# Altium integrated library Sajad_Altium_Library.IntLib: 390 symbols (part 1 of 3) (continued)
## ENC28J60T-I/SO (continued)

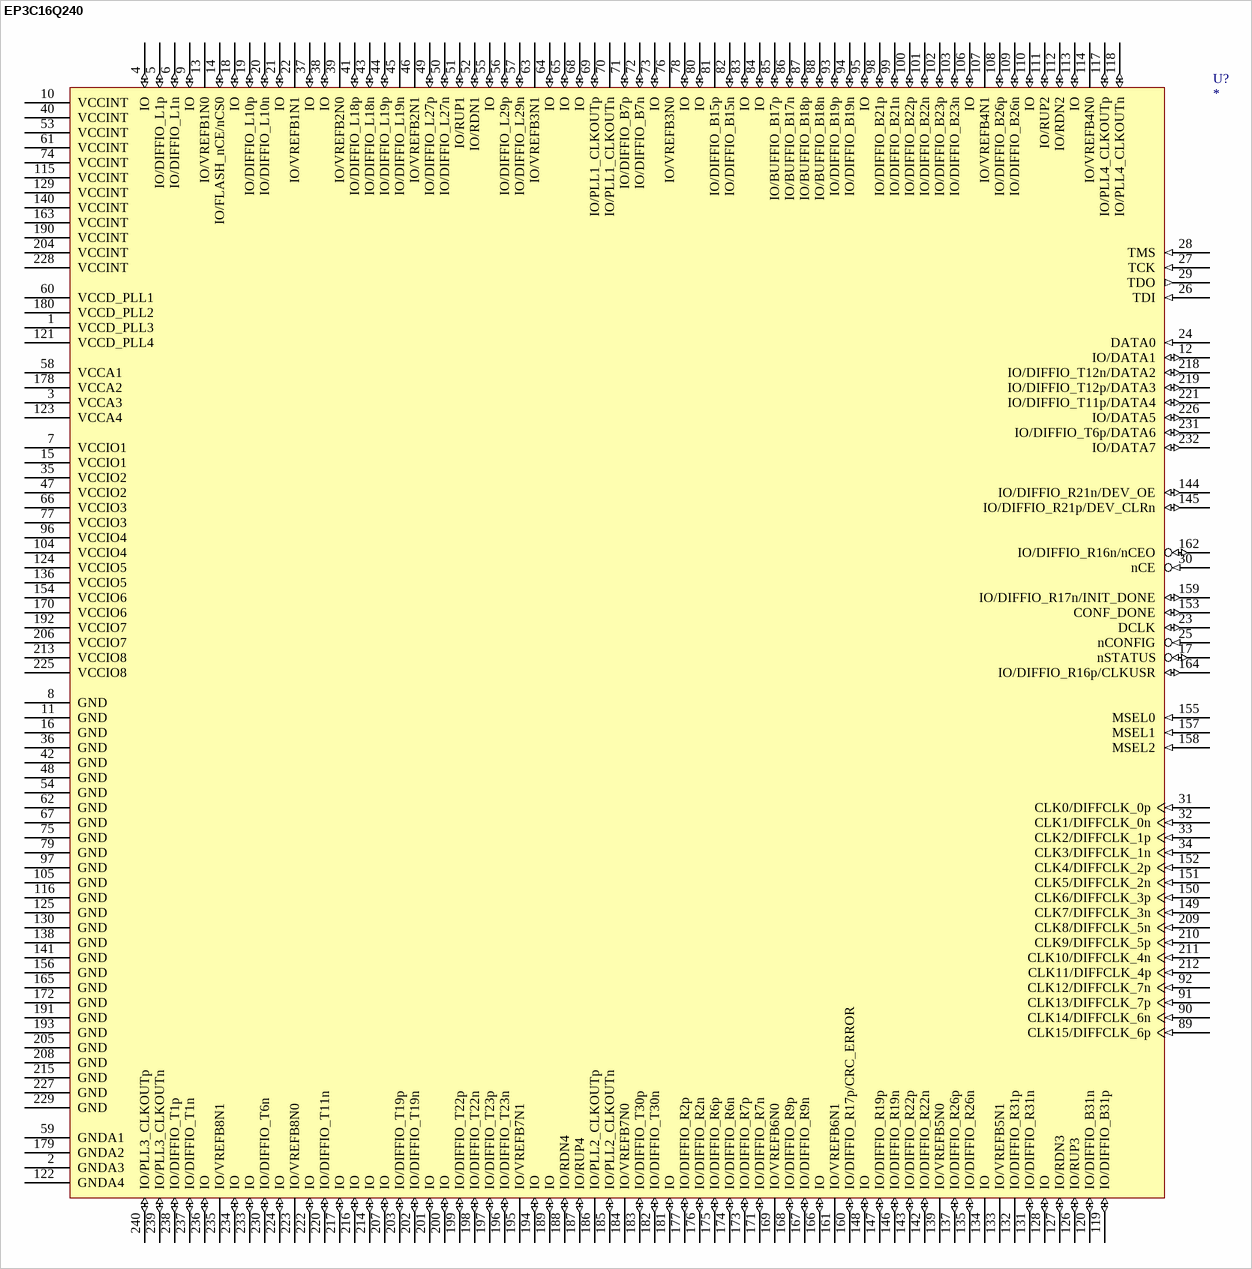
[diagram p3: symbol EP3C16Q240]

## EP3C16Q240
designator U?
Cyclone III EP3C-16 FPGA PQFP240
footprint PQFP240
pins: 1 VCCD_PLL3 (power), 2 GNDA3 (power), 3 VCCA3 (power), 4 IO (io), 5 IO/DIFFIO_L1p (io), 6 IO/DIFFIO_L1n (io), 7 VCCIO1, 8 GND (power), 9 IO (io), 10 VCCINT (power), 11 GND (power), 12 IO/DATA1 (io), 13 IO/VREFB1N0, 14 IO/FLASH_nCE/nCS0 (io), 15 VCCIO1 (power), 16 GND (power), 17 nSTATUS (io), 18 IO (io), 19 IO/DIFFIO_L10p (io), 20 IO/DIFFIO_L10n (io), 21 IO (io), 22 IO/VREFB1N1, 23 DCLK (io), 24 DATA0 (in), 25 nCONFIG (in), 26 TDI (in), 27 TCK (in), 28 TMS (in), 29 TDO (out), 30 nCE (in), 31 CLK0/DIFFCLK_0p (in), 32 CLK1/DIFFCLK_0n (in), 33 CLK2/DIFFCLK_1p (in), 34 CLK3/DIFFCLK_1n (in), 35 VCCIO2 (power), 36 GND, 37 IO (io), 38 IO (io), 39 IO/VREFB2N0, 40 VCCINT (power), 41 IO/DIFFIO_L18p (io), 42 GND, 43 IO/DIFFIO_L18n (io), 44 IO/DIFFIO_L19p (io), 45 IO/DIFFIO_L19n, 46 IO/VREFB2N1, 47 VCCIO2 (power), 48 GND (power), 49 IO/DIFFIO_L27p (io), 50 IO/DIFFIO_L27n (io), 51 IO/RUP1 (io), 52 IO/RDN1 (io), 53 VCCINT (power), 54 GND (power), 55 IO (io), 56 IO/DIFFIO_L29p (io), 57 IO/DIFFIO_L29n (io), 58 VCCA1 (power), 59 GNDA1 (power), 60 VCCD_PLL1 (power), 61 VCCINT (power), 62 GND (power), 63 IO/VREFB3N1, 64 IO (io), 65 IO (io), 66 VCCIO3 (power), 67 GND, 68 IO (io), 69 IO/PLL1_CLKOUTp (io), 70 IO/PLL1_CLKOUTn, 71 IO/DIFFIO_B7p (io), 72 IO/DIFFIO_B7n (io), 73 IO (io), 74 VCCINT (power), 75 GND (power), 76 IO/VREFB3N0, 77 VCCIO3 (power), 78 IO (io), 79 GND (power), 80 IO (io), 81 IO/DIFFIO_B15p, 82 IO/DIFFIO_B15n (io), 83 IO (io), 84 IO (io), 85 IO/BUFFIO_B17p (io), 86 IO/BUFFIO_B17n (io), 87 IO/BUFFIO_B18p (io), 88 IO/BUFFIO_B18n (io), 89 CLK15/DIFFCLK_6p (in), 90 CLK14/DIFFCLK_6n (in), 91 CLK13/DIFFCLK_7p (in), 92 CLK12/DIFFCLK_7n (in), 93 IO/DIFFIO_B19p (io), 94 IO/DIFFIO_B19n (io), 95 IO (io), 96 VCCIO4 (power), 97 GND (power), 98 IO/DIFFIO_B21p (io), 99 IO/DIFFIO_B21n (io), 100 IO/DIFFIO_B22p (io), 101 IO/DIFFIO_B22n (io), 102 IO/DIFFIO_B23p (io), 103 IO/DIFFIO_B23n (io), 104 VCCIO4 (power), 105 GND (power), 106 IO (io), 107 IO/VREFB4N1, 108 IO/DIFFIO_B26p (io), 109 IO/DIFFIO_B26n (io), 110 IO (io), 111 IO/RUP2 (io), 112 IO/RDN2 (io), 113 IO (io), 114 IO/VREFB4N0, 115 VCCINT (power), 116 GND (power), 117 IO/PLL4_CLKOUTp (io), 118 IO/PLL4_CLKOUTn (io), 119 IO/DIFFIO_B31p (io), 120 IO/DIFFIO_B31n (io), 121 VCCD_PLL4 (power), 122 GNDA4 (power), 123 VCCA4 (power), 124 VCCIO5 (power), 125 GND, 126 IO/RUP3 (io), 127 IO/RDN3 (io), 128 IO (io), 129 VCCINT (power), 130 GND (power), 131 IO/DIFFIO_R31n (io), 132 IO/DIFFIO_R31p, 133 IO/VREFB5N1, 134 IO, 135 IO/DIFFIO_R26n (io), 136 VCCIO5 (power), 137 IO/DIFFIO_R26p (io), 138 GND (power), 139 IO/VREFB5N0, 140 VCCINT (power), 141 GND (power), 142 IO/DIFFIO_R22n (io), 143 IO/DIFFIO_R22p (io), 144 IO/DIFFIO_R21n/DEV_OE (io), 145 IO/DIFFIO_R21p/DEV_CLRn (io), 146 IO/DIFFIO_R19n (io), 147 IO/DIFFIO_R19p (io), 148 IO (io), 149 CLK7/DIFFCLK_3n (in), 150 CLK6/DIFFCLK_3p (in), 151 CLK5/DIFFCLK_2n (in), 152 CLK4/DIFFCLK_2p (in), 153 CONF_DONE (io), 154 VCCIO6 (power), 155 MSEL0 (in), 156 GND (power), 157 MSEL1 (in), 158 MSEL2 (in), 159 IO/DIFFIO_R17n/INIT_DONE (io), 160 IO/DIFFIO_R17p/CRC_ERROR (io), 161 IO/VREFB6N1, 162 IO/DIFFIO_R16n/nCEO (io), 163 VCCINT (power), 164 IO/DIFFIO_R16p/CLKUSR (io), 165 GND (power), 166 IO (io), 167 IO/DIFFIO_R9n (io), 168 IO/DIFFIO_R9p (io), 169 IO/VREFB6N0, 170 VCCIO6 (power), 171 IO/DIFFIO_R7n (io), 172 GND (power), 173 IO/DIFFIO_R7p (io), 174 IO/DIFFIO_R6n (io), 175 IO/DIFFIO_R6p (io), 176 IO/DIFFIO_R2n (io), 177 IO/DIFFIO_R2p (io), 178 VCCA2 (power), 179 GNDA2 (power), 180 VCCD_PLL2 (power), 181 IO (io), 182 IO/DIFFIO_T30n (io), 183 IO/DIFFIO_T30p (io), 184 IO/VREFB7N0, 185 IO/PLL2_CLKOUTn (io), 186 IO/PLL2_CLKOUTp, 187 IO/RUP4 (io), 188 IO/RDN4 (io), 189 IO (io), 190 VCCINT (power), 191 GND (power), 192 VCCIO7 (power), 193 GND (power), 194 IO (io), 195 IO/VREFB7N1, 196 IO/DIFFIO_T23n (io), 197 IO/DIFFIO_T23p (io), 198 IO/DIFFIO_T22n (io), 199 IO/DIFFIO_T22p (io), 200 IO (io), 201 IO (io), 202 IO/DIFFIO_T19n (io), 203 IO/DIFFIO_T19p (io), 204 VCCINT (power), 205 GND (power), 206 VCCIO7 (power), 207 IO (io), 208 GND (power), 209 CLK8/DIFFCLK_5n (in), 210 CLK9/DIFFCLK_5p (in), 211 CLK10/DIFFCLK_4n (in), 212 CLK11/DIFFCLK_4p (in), 213 VCCIO8 (power), 214 IO (io), 215 GND (power), 216 IO (io), 217 IO (io), 218 IO/DIFFIO_T12n/DATA2 (io), 219 IO/DIFFIO_T12p/DATA3 (io), 220 IO/DIFFIO_T11n (io), 221 IO/DIFFIO_T11p/DATA4 (io), 222 IO (io), 223 IO/VREFB8N0, 224 IO (io), 225 VCCIO8 (power), 226 IO/DATA5 (io), 227 GND (power), 228 VCCINT (power), 229 GND (power), 230 IO/DIFFIO_T6n (io), 231 IO/DIFFIO_T6p/DATA6 (io), 232 IO/DATA7 (io), 233 IO (io), 234 IO (io), 235 IO/VREFB8N1, 236 IO (io), 237 IO/DIFFIO_T1n (io), 238 IO/DIFFIO_T1p (io), 239 IO/PLL3_CLKOUTn (io), 240 IO/PLL3_CLKOUTp (io)

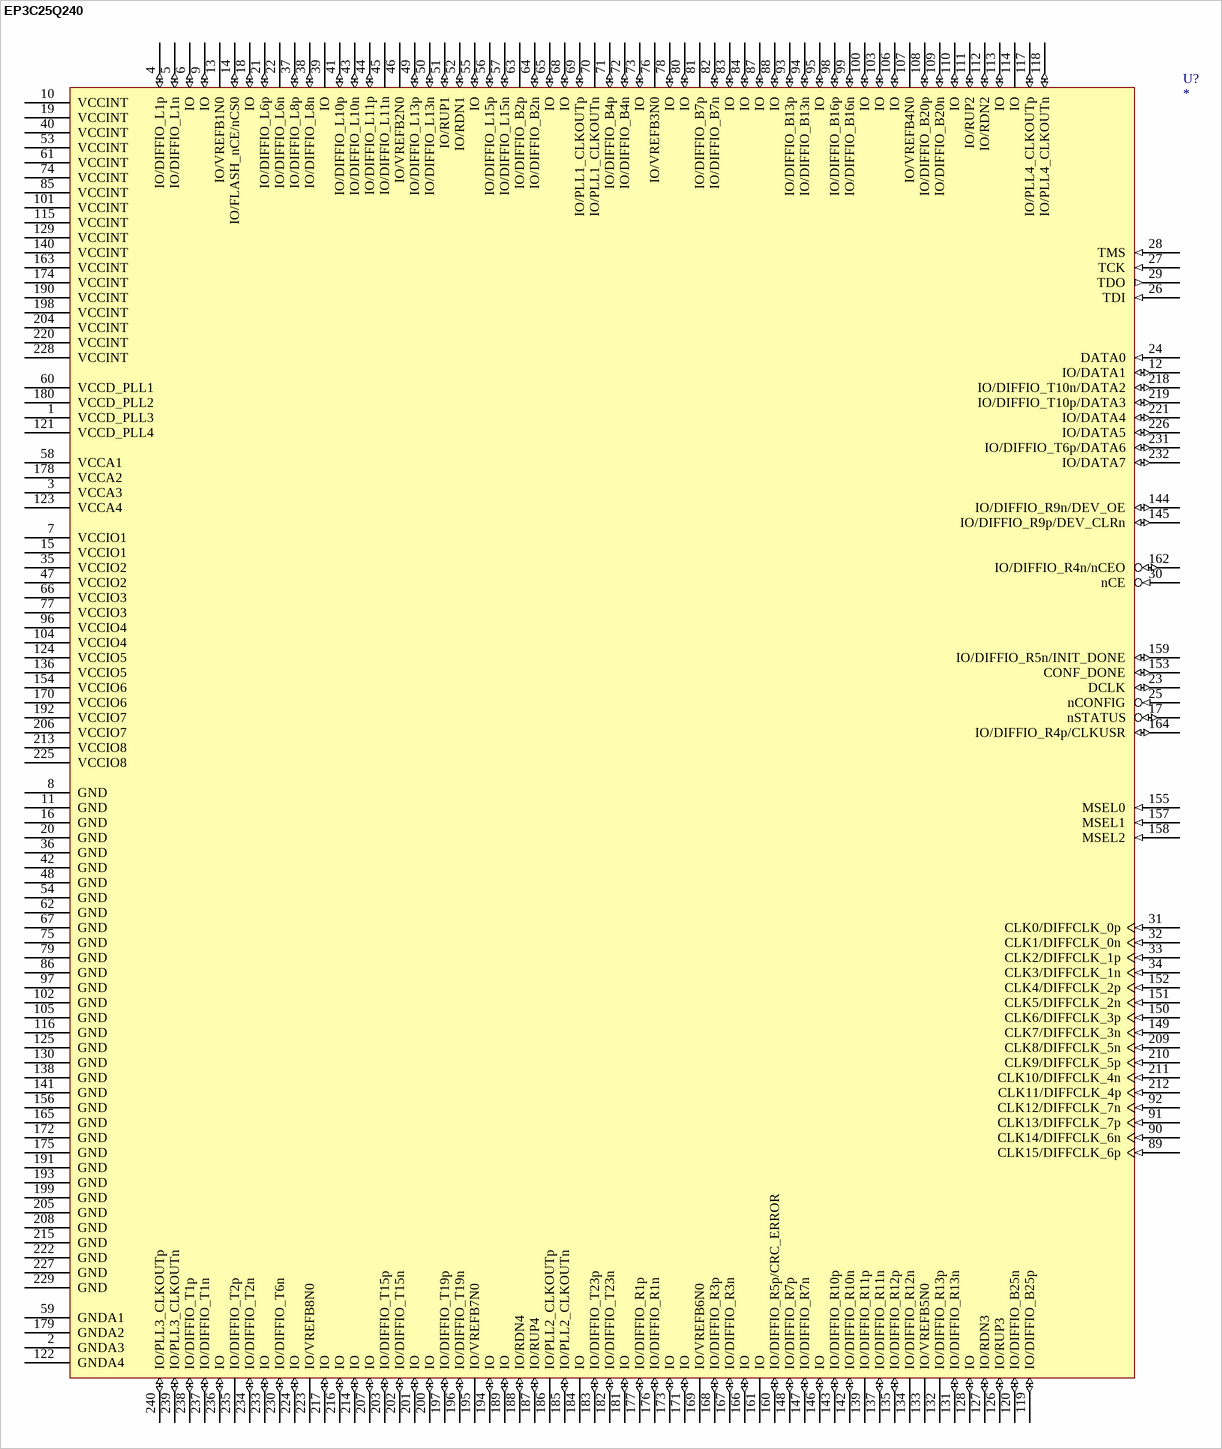
[diagram p4: symbol EP3C25Q240]

## EP3C25Q240
designator U?
Cyclone III EP3C-25 FPGA PQFP240
footprint PQFP240
pins: 1 VCCD_PLL3 (power), 2 GNDA3 (power), 3 VCCA3 (power), 4 IO/DIFFIO_L1p (io), 5 IO/DIFFIO_L1n (io), 6 IO (io), 7 VCCIO1, 8 GND (power), 9 IO (io), 10 VCCINT (power), 11 GND (power), 12 IO/DATA1 (io), 13 IO/VREFB1N0, 14 IO/FLASH_nCE/nCS0 (io), 15 VCCIO1 (power), 16 GND (power), 17 nSTATUS (io), 18 IO (io), 19 VCCINT (power), 20 GND (power), 21 IO/DIFFIO_L6p (io), 22 IO/DIFFIO_L6n, 23 DCLK (io), 24 DATA0 (in), 25 nCONFIG (in), 26 TDI (in), 27 TCK (in), 28 TMS (in), 29 TDO (out), 30 nCE (in), 31 CLK0/DIFFCLK_0p (in), 32 CLK1/DIFFCLK_0n (in), 33 CLK2/DIFFCLK_1p (in), 34 CLK3/DIFFCLK_1n (in), 35 VCCIO2 (power), 36 GND, 37 IO/DIFFIO_L8p (io), 38 IO/DIFFIO_L8n (io), 39 IO, 40 VCCINT (power), 41 IO/DIFFIO_L10p (io), 42 GND, 43 IO/DIFFIO_L10n (io), 44 IO/DIFFIO_L11p (io), 45 IO/DIFFIO_L11n, 46 IO/VREFB2N0, 47 VCCIO2 (power), 48 GND (power), 49 IO/DIFFIO_L13p (io), 50 IO/DIFFIO_L13n (io), 51 IO/RUP1 (io), 52 IO/RDN1 (io), 53 VCCINT (power), 54 GND (power), 55 IO (io), 56 IO/DIFFIO_L15p (io), 57 IO/DIFFIO_L15n (io), 58 VCCA1 (power), 59 GNDA1 (power), 60 VCCD_PLL1 (power), 61 VCCINT (power), 62 GND (power), 63 IO/DIFFIO_B2p, 64 IO/DIFFIO_B2n (io), 65 IO (io), 66 VCCIO3 (power), 67 GND, 68 IO (io), 69 IO/PLL1_CLKOUTp (io), 70 IO/PLL1_CLKOUTn, 71 IO/DIFFIO_B4p (io), 72 IO/DIFFIO_B4n (io), 73 IO (io), 74 VCCINT (power), 75 GND (power), 76 IO/VREFB3N0, 77 VCCIO3 (power), 78 IO (io), 79 GND (power), 80 IO (io), 81 IO/DIFFIO_B7p, 82 IO/DIFFIO_B7n (io), 83 IO (io), 84 IO (io), 85 VCCINT (power), 86 GND (power), 87 IO (io), 88 IO (io), 89 CLK15/DIFFCLK_6p (in), 90 CLK14/DIFFCLK_6n (in), 91 CLK13/DIFFCLK_7p (in), 92 CLK12/DIFFCLK_7n (in), 93 IO/DIFFIO_B13p (io), 94 IO/DIFFIO_B13n (io), 95 IO (io), 96 VCCIO4 (power), 97 GND (power), 98 IO/DIFFIO_B16p (io), 99 IO/DIFFIO_B16n (io), 100 IO (io), 101 VCCINT (power), 102 GND (power), 103 IO (io), 104 VCCIO4 (power), 105 GND (power), 106 IO (io), 107 IO/VREFB4N0, 108 IO/DIFFIO_B20p (io), 109 IO/DIFFIO_B20n (io), 110 IO (io), 111 IO/RUP2 (io), 112 IO/RDN2 (io), 113 IO (io), 114 IO, 115 VCCINT (power), 116 GND (power), 117 IO/PLL4_CLKOUTp (io), 118 IO/PLL4_CLKOUTn (io), 119 IO/DIFFIO_B25p (io), 120 IO/DIFFIO_B25n (io), 121 VCCD_PLL4 (power), 122 GNDA4 (power), 123 VCCA4 (power), 124 VCCIO5 (power), 125 GND, 126 IO/RUP3 (io), 127 IO/RDN3 (io), 128 IO (io), 129 VCCINT (power), 130 GND (power), 131 IO/DIFFIO_R13n (io), 132 IO/DIFFIO_R13p, 133 IO/VREFB5N0, 134 IO/DIFFIO_R12n, 135 IO/DIFFIO_R12p (io), 136 VCCIO5 (power), 137 IO/DIFFIO_R11n (io), 138 GND (power), 139 IO/DIFFIO_R11p, 140 VCCINT (power), 141 GND (power), 142 IO/DIFFIO_R10n (io), 143 IO/DIFFIO_R10p (io), 144 IO/DIFFIO_R9n/DEV_OE (io), 145 IO/DIFFIO_R9p/DEV_CLRn (io), 146 IO (io), 147 IO/DIFFIO_R7n (io), 148 IO/DIFFIO_R7p (io), 149 CLK7/DIFFCLK_3n (in), 150 CLK6/DIFFCLK_3p (in), 151 CLK5/DIFFCLK_2n (in), 152 CLK4/DIFFCLK_2p (in), 153 CONF_DONE (io), 154 VCCIO6 (power), 155 MSEL0 (in), 156 GND (power), 157 MSEL1 (in), 158 MSEL2 (in), 159 IO/DIFFIO_R5n/INIT_DONE (io), 160 IO/DIFFIO_R5p/CRC_ERROR (io), 161 IO, 162 IO/DIFFIO_R4n/nCEO (io), 163 VCCINT (power), 164 IO/DIFFIO_R4p/CLKUSR (io), 165 GND (power), 166 IO (io), 167 IO/DIFFIO_R3n (io), 168 IO/DIFFIO_R3p (io), 169 IO/VREFB6N0, 170 VCCIO6 (power), 171 IO (io), 172 GND (power), 173 IO (io), 174 VCCINT (power), 175 GND (power), 176 IO/DIFFIO_R1n (io), 177 IO/DIFFIO_R1p (io), 178 VCCA2 (power), 179 GNDA2 (power), 180 VCCD_PLL2 (power), 181 IO (io), 182 IO/DIFFIO_T23n (io), 183 IO/DIFFIO_T23p (io), 184 IO, 185 IO/PLL2_CLKOUTn (io), 186 IO/PLL2_CLKOUTp, 187 IO/RUP4 (io), 188 IO/RDN4 (io), 189 IO (io), 190 VCCINT (power), 191 GND (power), 192 VCCIO7 (power), 193 GND (power), 194 IO (io), 195 IO/VREFB7N0, 196 IO/DIFFIO_T19n (io), 197 IO/DIFFIO_T19p (io), 198 VCCINT (power), 199 GND (power), 200 IO (io), 201 IO (io), 202 IO/DIFFIO_T15n (io), 203 IO/DIFFIO_T15p (io), 204 VCCINT (power), 205 GND (power), 206 VCCIO7 (power), 207 IO (io), 208 GND (power), 209 CLK8/DIFFCLK_5n (in), 210 CLK9/DIFFCLK_5p (in), 211 CLK10/DIFFCLK_4n (in), 212 CLK11/DIFFCLK_4p (in), 213 VCCIO8 (power), 214 IO (io), 215 GND (power), 216 IO (io), 217 IO (io), 218 IO/DIFFIO_T10n/DATA2 (io), 219 IO/DIFFIO_T10p/DATA3 (io), 220 VCCINT (power), 221 IO/DATA4 (io), 222 GND (power), 223 IO/VREFB8N0, 224 IO (io), 225 VCCIO8 (power), 226 IO/DATA5 (io), 227 GND (power), 228 VCCINT (power), 229 GND (power), 230 IO/DIFFIO_T6n (io), 231 IO/DIFFIO_T6p/DATA6 (io), 232 IO/DATA7 (io), 233 IO (io), 234 IO/DIFFIO_T2n (io), 235 IO/DIFFIO_T2p, 236 IO (io), 237 IO/DIFFIO_T1n (io), 238 IO/DIFFIO_T1p (io), 239 IO/PLL3_CLKOUTn (io), 240 IO/PLL3_CLKOUTp (io)

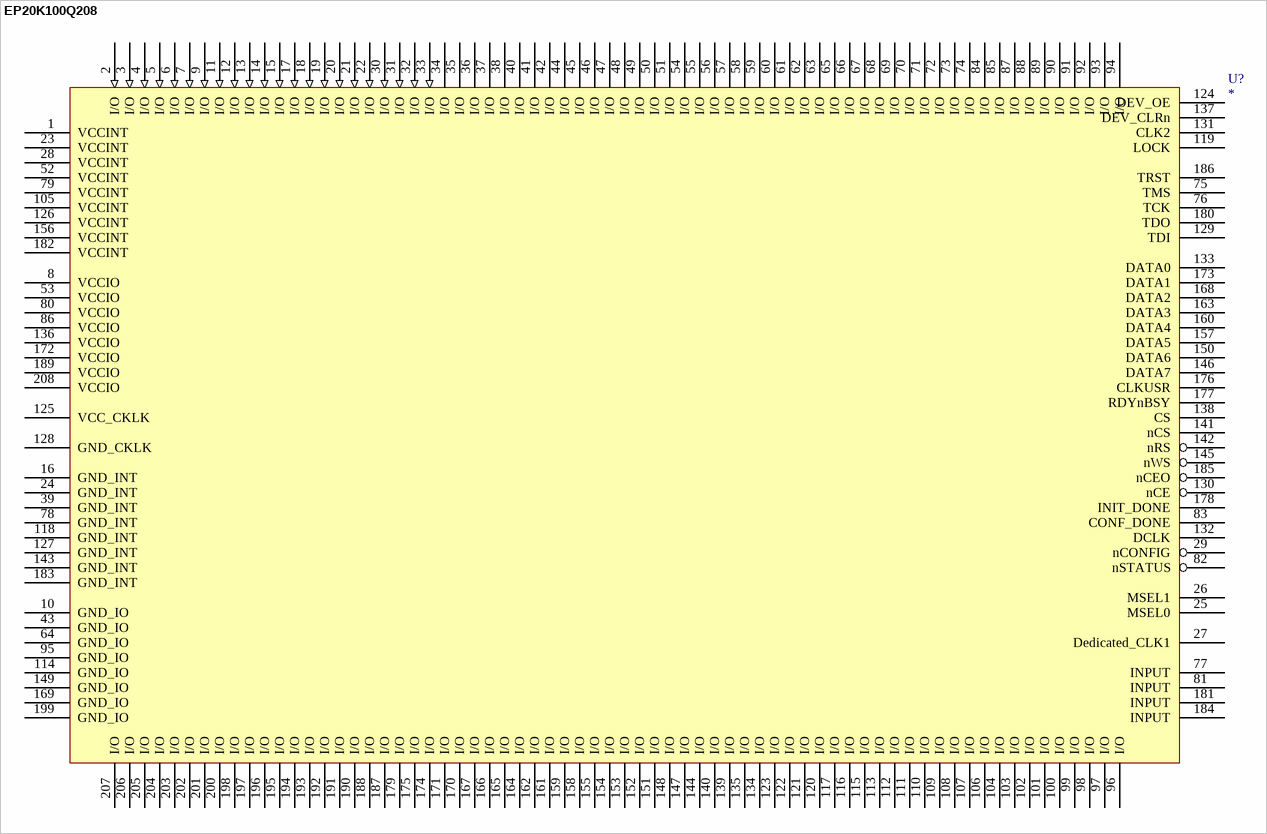
[diagram p5: symbol EP20K100Q208]

## EP20K100Q208
designator U?
Apex20K200 208-pin PQFP
footprint PQFP208
pins: 1 VCCINT, 2 I/O (in), 3 I/O (in), 4 I/O (in), 5 I/O (in), 6 I/O (in), 7 I/O (in), 8 VCCIO, 9 I/O (in), 10 GND_IO, 11 I/O (in), 12 I/O (in), 13 I/O (in), 14 I/O (in), 15 I/O (in), 16 GND_INT, 17 I/O (in), 18 I/O (in), 19 I/O (in), 20 I/O (in), 21 I/O (in), 22 I/O (in), 23 VCCINT, 24 GND_INT, 25 MSEL0, 26 MSEL1, 27 Dedicated_CLK1, 28 VCCINT, 29 nCONFIG, 30 I/O (in), 31 I/O (in), 32 I/O (in), 33 I/O (in), 34 I/O, 35 I/O, 36 I/O, 37 I/O, 38 I/O, 39 GND_INT, 40 I/O, 41 I/O, 42 I/O, 43 GND_IO, 44 I/O, 45 I/O, 46 I/O, 47 I/O, 48 I/O, 49 I/O, 50 I/O, 51 I/O, 52 VCCINT, 53 VCCIO, 54 I/O, 55 I/O, 56 I/O, 57 I/O, 58 I/O, 59 I/O, 60 I/O, 61 I/O, 62 I/O, 63 I/O, 64 GND_IO, 65 I/O, 66 I/O, 67 I/O, 68 I/O, 69 I/O, 70 I/O, 71 I/O, 72 I/O, 73 I/O, 74 I/O, 75 TMS, 76 TCK, 77 INPUT, 78 GND_INT, 79 VCCINT, 80 VCCIO, 81 INPUT, 82 nSTATUS, 83 CONF_DONE, 84 I/O, 85 I/O, 86 VCCIO, 87 I/O, 88 I/O, 89 I/O, 90 I/O, 91 I/O, 92 I/O, 93 I/O, 94 I/O, 95 GND_IO, 96 I/O, 97 I/O, 98 I/O, 99 I/O, 100 I/O, 101 I/O, 102 I/O, 103 I/O, 104 I/O, 105 VCCINT, 106 I/O, 107 I/O, 108 I/O, 109 I/O, 110 I/O, 111 I/O, 112 I/O, 113 I/O, 114 GND_IO, 115 I/O, 116 I/O, 117 I/O, 118 GND_INT, 119 LOCK, 120 I/O, 121 I/O, 122 I/O, 123 I/O, 124 DEV_OE, 125 VCC_CKLK, 126 VCCINT, 127 GND_INT, 128 GND_CKLK, 129 TDI, 130 nCE, 131 CLK2, 132 DCLK, 133 DATA0, 134 I/O, 135 I/O, 136 VCCIO, 137 DEV_CLRn, 138 CS, 139 I/O, 140 I/O, 141 nCS, 142 nRS, 143 GND_INT, 144 I/O, 145 nWS, 146 DATA7, 147 I/O, 148 I/O, 149 GND_IO, 150 DATA6, 151 I/O, 152 I/O, 153 I/O, 154 I/O, 155 I/O, 156 VCCINT, 157 DATA5, 158 I/O, 159 I/O, 160 DATA4, 161 I/O, 162 I/O, 163 DATA3, 164 I/O, 165 I/O, 166 I/O, 167 I/O, 168 DATA2, 169 GND_IO, 170 I/O, 171 I/O, 172 VCCIO, 173 DATA1, 174 I/O, 175 I/O, 176 CLKUSR, 177 RDYnBSY, 178 INIT_DONE, 179 I/O, 180 TDO, 181 INPUT, 182 VCCINT, 183 GND_INT, 184 INPUT, 185 nCEO, 186 TRST, 187 I/O, 188 I/O, 189 VCCIO, 190 I/O, 191 I/O, 192 I/O, 193 I/O, 194 I/O, 195 I/O, 196 I/O, 197 I/O, 198 I/O, 199 GND_IO, 200 I/O, 201 I/O, 202 I/O, 203 I/O, 204 I/O, 205 I/O, 206 I/O, 207 I/O, 208 VCCIO

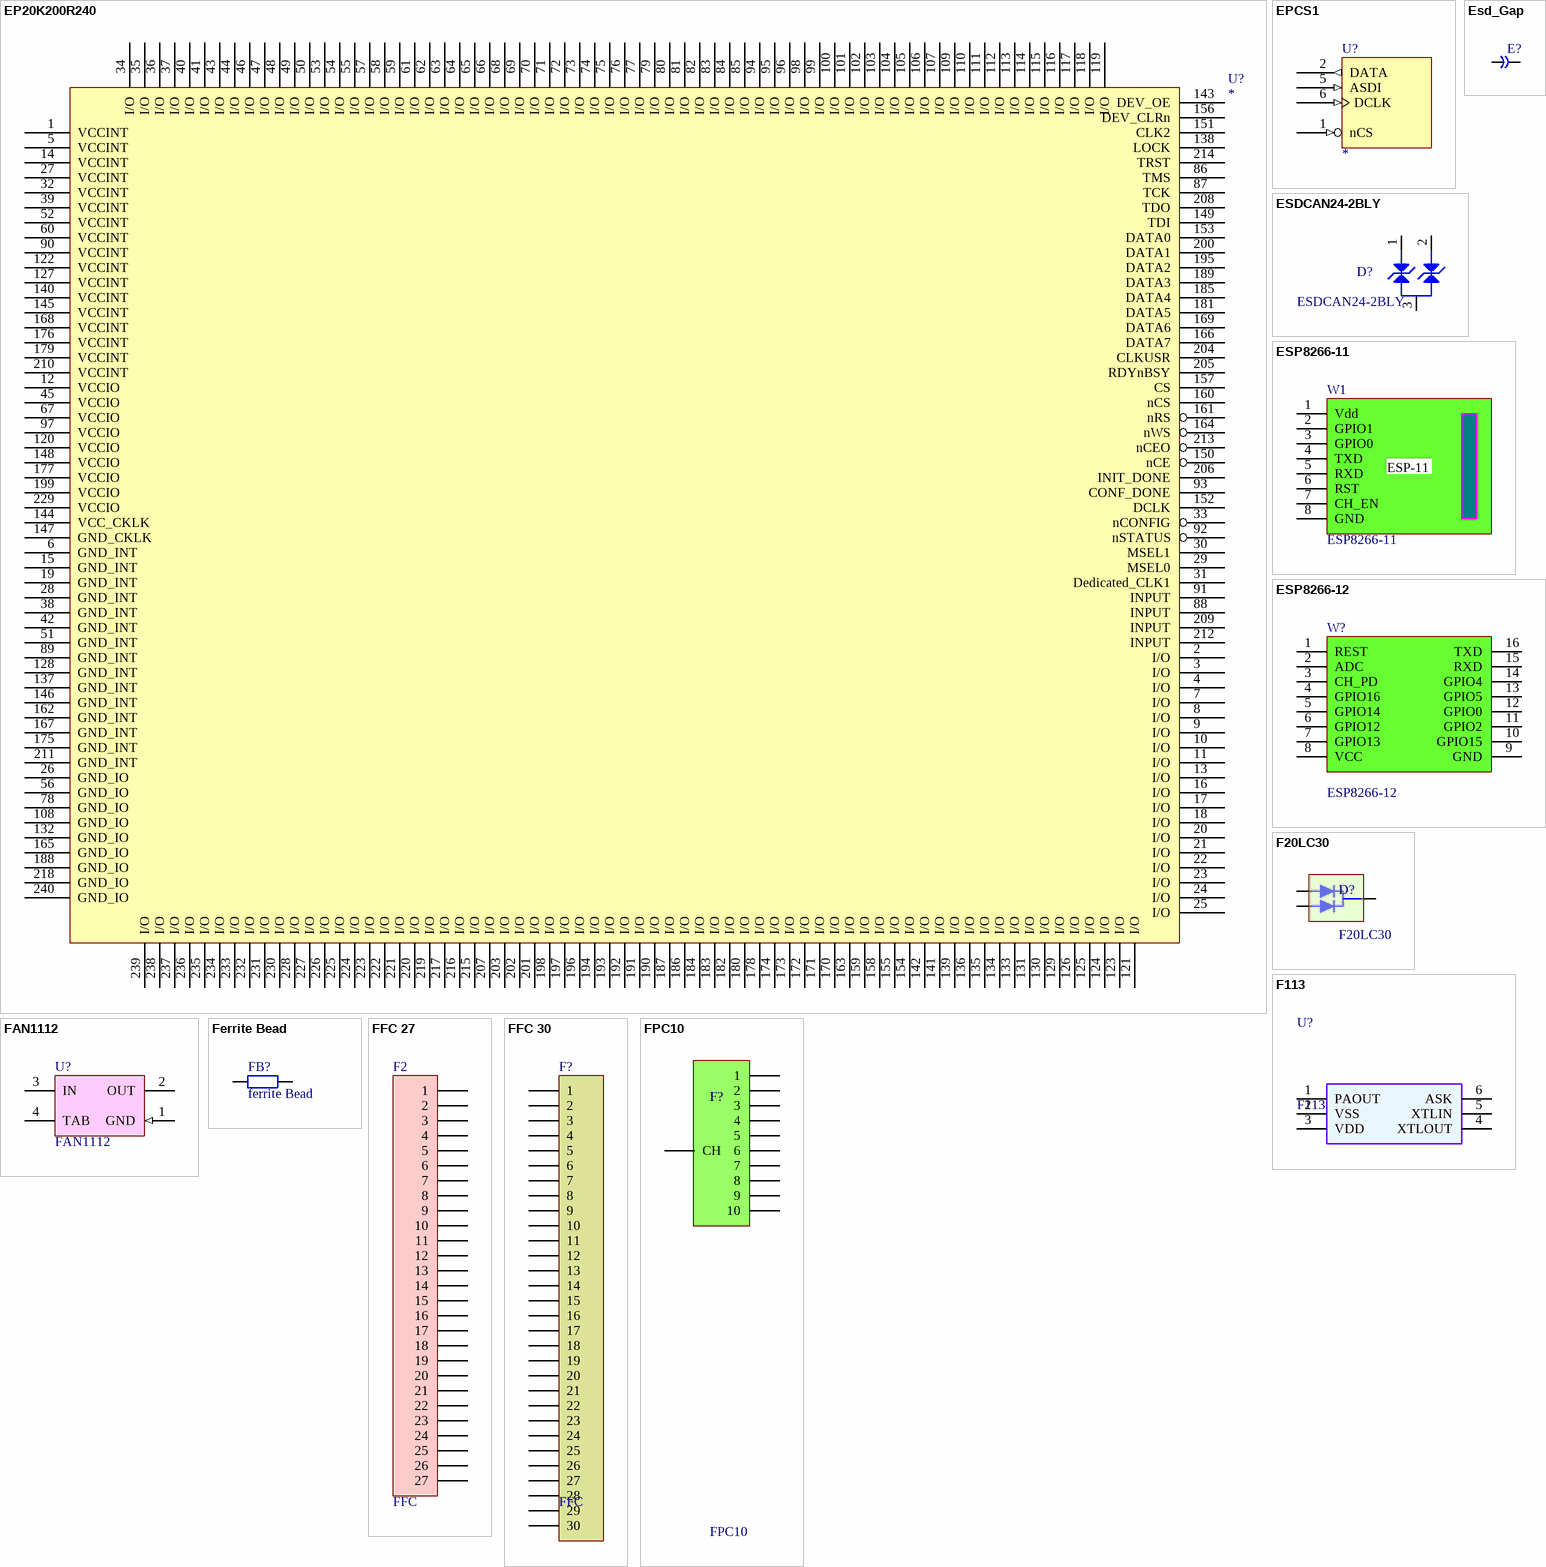
[diagram p6: symbols EP20K200R240 to FPC10]

## EP20K200R240
designator U?
Apex20K200 240-pin RQFP
footprint RQFP240
pins: 1 VCCINT, 2 I/O, 3 I/O, 4 I/O, 5 VCCINT, 6 GND_INT, 7 I/O, 8 I/O, 9 I/O, 10 I/O, 11 I/O, 12 VCCIO, 13 I/O, 14 VCCINT, 15 GND_INT, 16 I/O, 17 I/O, 18 I/O, 19 GND_INT, 20 I/O, 21 I/O, 22 I/O, 23 I/O, 24 I/O, 25 I/O, 26 GND_IO, 27 VCCINT, 28 GND_INT, 29 MSEL0, 30 MSEL1, 31 Dedicated_CLK1, 32 VCCINT, 33 nCONFIG, 34 I/O, 35 I/O, 36 I/O, 37 I/O, 38 GND_INT, 39 VCCINT, 40 I/O, 41 I/O, 42 GND_INT, 43 I/O, 44 I/O, 45 VCCIO, 46 I/O, 47 I/O, 48 I/O, 49 I/O, 50 I/O, 51 GND_INT, 52 VCCINT, 53 I/O, 54 I/O, 55 I/O, 56 GND_IO, 57 I/O, 58 I/O, 59 I/O, 60 VCCINT, 61 I/O, 62 I/O, 63 I/O, 64 I/O, 65 I/O, 66 I/O, 67 VCCIO, 68 I/O, 69 I/O, 70 I/O, 71 I/O, 72 I/O, 73 I/O, 74 I/O, 75 I/O, 76 I/O, 77 I/O, 78 GND_IO, 79 I/O, 80 I/O, 81 I/O, 82 I/O, 83 I/O, 84 I/O, 85 I/O, 86 TMS, 87 TCK, 88 INPUT, 89 GND_INT, 90 VCCINT, 91 INPUT, 92 nSTATUS, 93 CONF_DONE, 94 I/O, 95 I/O, 96 I/O, 97 VCCIO, 98 I/O, 99 I/O, 100 I/O, 101 I/O, 102 I/O, 103 I/O, 104 I/O, 105 I/O, 106 I/O, 107 I/O, 108 GND_IO, 109 I/O, 110 I/O, 111 I/O, 112 I/O, 113 I/O, 114 I/O, 115 I/O, 116 I/O, 117 I/O, 118 I/O, 119 I/O, 120 VCCIO, 121 I/O, 122 VCCINT, 123 I/O, 124 I/O, 125 I/O, 126 I/O, 127 VCCINT, 128 GND_INT, 129 I/O, 130 I/O, 131 I/O, 132 GND_IO, 133 I/O, 134 I/O, 135 I/O, 136 I/O, 137 GND_INT, 138 LOCK, 139 I/O, 140 VCCINT, 141 I/O, 142 I/O, 143 DEV_OE, 144 VCC_CKLK, 145 VCCINT, 146 GND_INT, 147 GND_CKLK, 148 VCCIO, 149 TDI, 150 nCE, 151 CLK2, 152 DCLK, 153 DATA0, 154 I/O, 155 I/O, 156 DEV_CLRn, 157 CS, 158 I/O, 159 I/O, 160 nCS, 161 nRS, 162 GND_INT, 163 I/O, 164 nWS, 165 GND_IO, 166 DATA7, 167 GND_INT, 168 VCCINT, 169 DATA6, 170 I/O, 171 I/O, 172 I/O, 173 I/O, 174 I/O, 175 GND_INT, 176 VCCINT, 177 VCCIO, 178 I/O, 179 VCCINT, 180 I/O, 181 DATA5, 182 I/O, 183 I/O, 184 I/O, 185 DATA4, 186 I/O, 187 I/O, 188 GND_IO, 189 DATA3, 190 I/O, 191 I/O, 192 I/O, 193 I/O, 194 I/O, 195 DATA2, 196 I/O, 197 I/O, 198 I/O, 199 VCCIO, 200 DATA1, 201 I/O, 202 I/O, 203 I/O, 204 CLKUSR, 205 RDYnBSY, 206 INIT_DONE, 207 I/O, 208 TDO, 209 INPUT, 210 VCCINT, 211 GND_INT, 212 INPUT, 213 nCEO, 214 TRST, 215 I/O, 216 I/O, 217 I/O, 218 GND_IO, 219 I/O, 220 I/O, 221 I/O, 222 I/O, 223 I/O, 224 I/O, 225 I/O, 226 I/O, 227 I/O, 228 I/O, 229 VCCIO, 230 I/O, 231 I/O, 232 I/O, 233 I/O, 234 I/O, 235 I/O, 236 I/O, 237 I/O, 238 I/O, 239 I/O, 240 GND_IO

## EPCS1
designator U?
Altera Serial Configuration Device
footprint SO-8
footprint SO-16
pins: 1 nCS (in), 2 DATA (out), 3 Vcc (power) hidden to Vcc, 4 GND (power) hidden to GND, 5 ASDI (in), 6 DCLK (in), 7 Vcc (power) hidden to Vcc, 8 Vcc (power) hidden to Vcc

## Esd_Gap
designator E?, comment Esd Gap  (value not drawn)
EsdGap; Published: 8-Jun-2000; LatestRevisionDate: 17-Jul-2002; LatestRevisionNote: Re-released for DXP Platform.; PackageReference: AXIAL-0.3; Publisher: Altium Limited
footprint Esd Gap (Esp Gap)
pins: 1, 2

## ESDCAN24-2BLY
designator D?
footprint SOT-23
footprint SOT23-213 (Footprint not found)
pins: 1, 2, 3

## ESP8266-11
designator W1
ESP8266 serial WIFI model ESP-11
footprint ESP8266-11
pins: 1 Vdd, 2 GPIO1, 3 GPIO0, 4 TXD, 5 RXD, 6 RST, 7 CH_EN, 8 GND
2 alternate drawings of the same symbol
text: ESP-11

## ESP8266-12
designator W?
ESP8266 serial WIFI model ESP-12
pins: 1 REST, 2 ADC, 3 CH_PD, 4 GPIO16, 5 GPIO14, 6 GPIO12, 7 GPIO13, 8 VCC, 9 GND, 10 GPIO15, 11 GPIO2, 12 GPIO0, 13 GPIO5, 14 GPIO4, 15 RXD, 16 TXD
2 alternate drawings of the same symbol

## F20LC30
designator D?
Supter fast Recovery Rectifier 300v 20A
footprint TO220
pins: 1 A1, 2 K, 3 A2

## F113
designator U?
F113_syn113 300-450mhz Ask Transmitter Chip_rf Ic
footprint PG-TSOP6 (High Precision Hall-Effect Switch with   Direction Detection)
pins: 1 PAOUT "Speed", 2 VSS, 3 VDD "Direction", 4 XTLOUT "Supply voltage", 5 XTLIN, 6 ASK

## FAN1112
designator U?
1A 1.2V Low Dropout Linear Regulator; PartNumber: LM317EMP; Manufacturer: National Semiconductor; CompType: LDO IC; PackageTopMarking: XYTT*N01A; PowerWise: N; Published: 4-Dec-2008; DatasheetVersion: Apr-2007; PackageVersion: revB, Apr-2003; PackageReference: MP04A; Publisher: Altium Limited; PackageDescription: Molded SOT-223, 6.50 x 3.56 x 1.6mm Body, 4 Lead, 2.3mm Pitch; RoHS: O; PinCount: 4; DigiKeyPartNumber: LM317EMPCT-ND; Code_JEDEC: TO-261-AA; Code_IPC: SOT223-4; ComponentLink1Description: LM317 Datasheet; ComponentLink1URL: http://www.national.com/ds/LM/LM317.pdf; ComponentLink2Description: LM317 Web Page; ComponentLink2URL: http://www.national.com/pf/LM/LM317.html; ComponentLink3Description: MP04A Package Page; ComponentLink3URL: http://www.national.com/packaging/folders/mp04a.html
footprint SOT223
pins: 1 GND (in), 2 OUT (power), 3 IN (power), 4 TAB (power)

## Ferrite Bead
designator FB?, comment ferrite Bead
Resistor; Published: 8-Jun-2000; LatestRevisionDate: 17-Jul-2002; LatestRevisionNote: Re-released for DXP Platform.; PackageReference: AXIAL-0.4; Publisher: Altium Limited; PackageDescription: Axial Device, Thru-Hole; 2 Leads; 0.4 in Pin Spacing
footprint AXIAL-0.4 - ferrite bead (Axial Device, Thru-Hole; 2 Leads; 0.4 in Pin Spacing)
pins: 1, 2

## FFC 27
designator F2, comment FFC
FFC connector 27pin
footprint ffc Connector 27
pins: 1, 2, 3, 4, 5, 6, 7, 8, 9, 10, 11, 12, 13, 14, 15, 16, 17, 18, 19, 20, 21, 22, 23, 24, 25, 26, 27

## FFC 30
designator F?, comment FFC
FFC connector 30 pin
footprint ffc Connector 30
pins: 1, 2, 3, 4, 5, 6, 7, 8, 9, 10, 11, 12, 13, 14, 15, 16, 17, 18, 19, 20, 21, 22, 23, 24, 25, 26, 27, 28, 29, 30

## FPC10
designator F?
FPC 10 smd
footprint FPC 10Pin (Chess Connector)
pins: 1, 2, 3, 4, 5, 6, 7, 8, 9, 10, CH

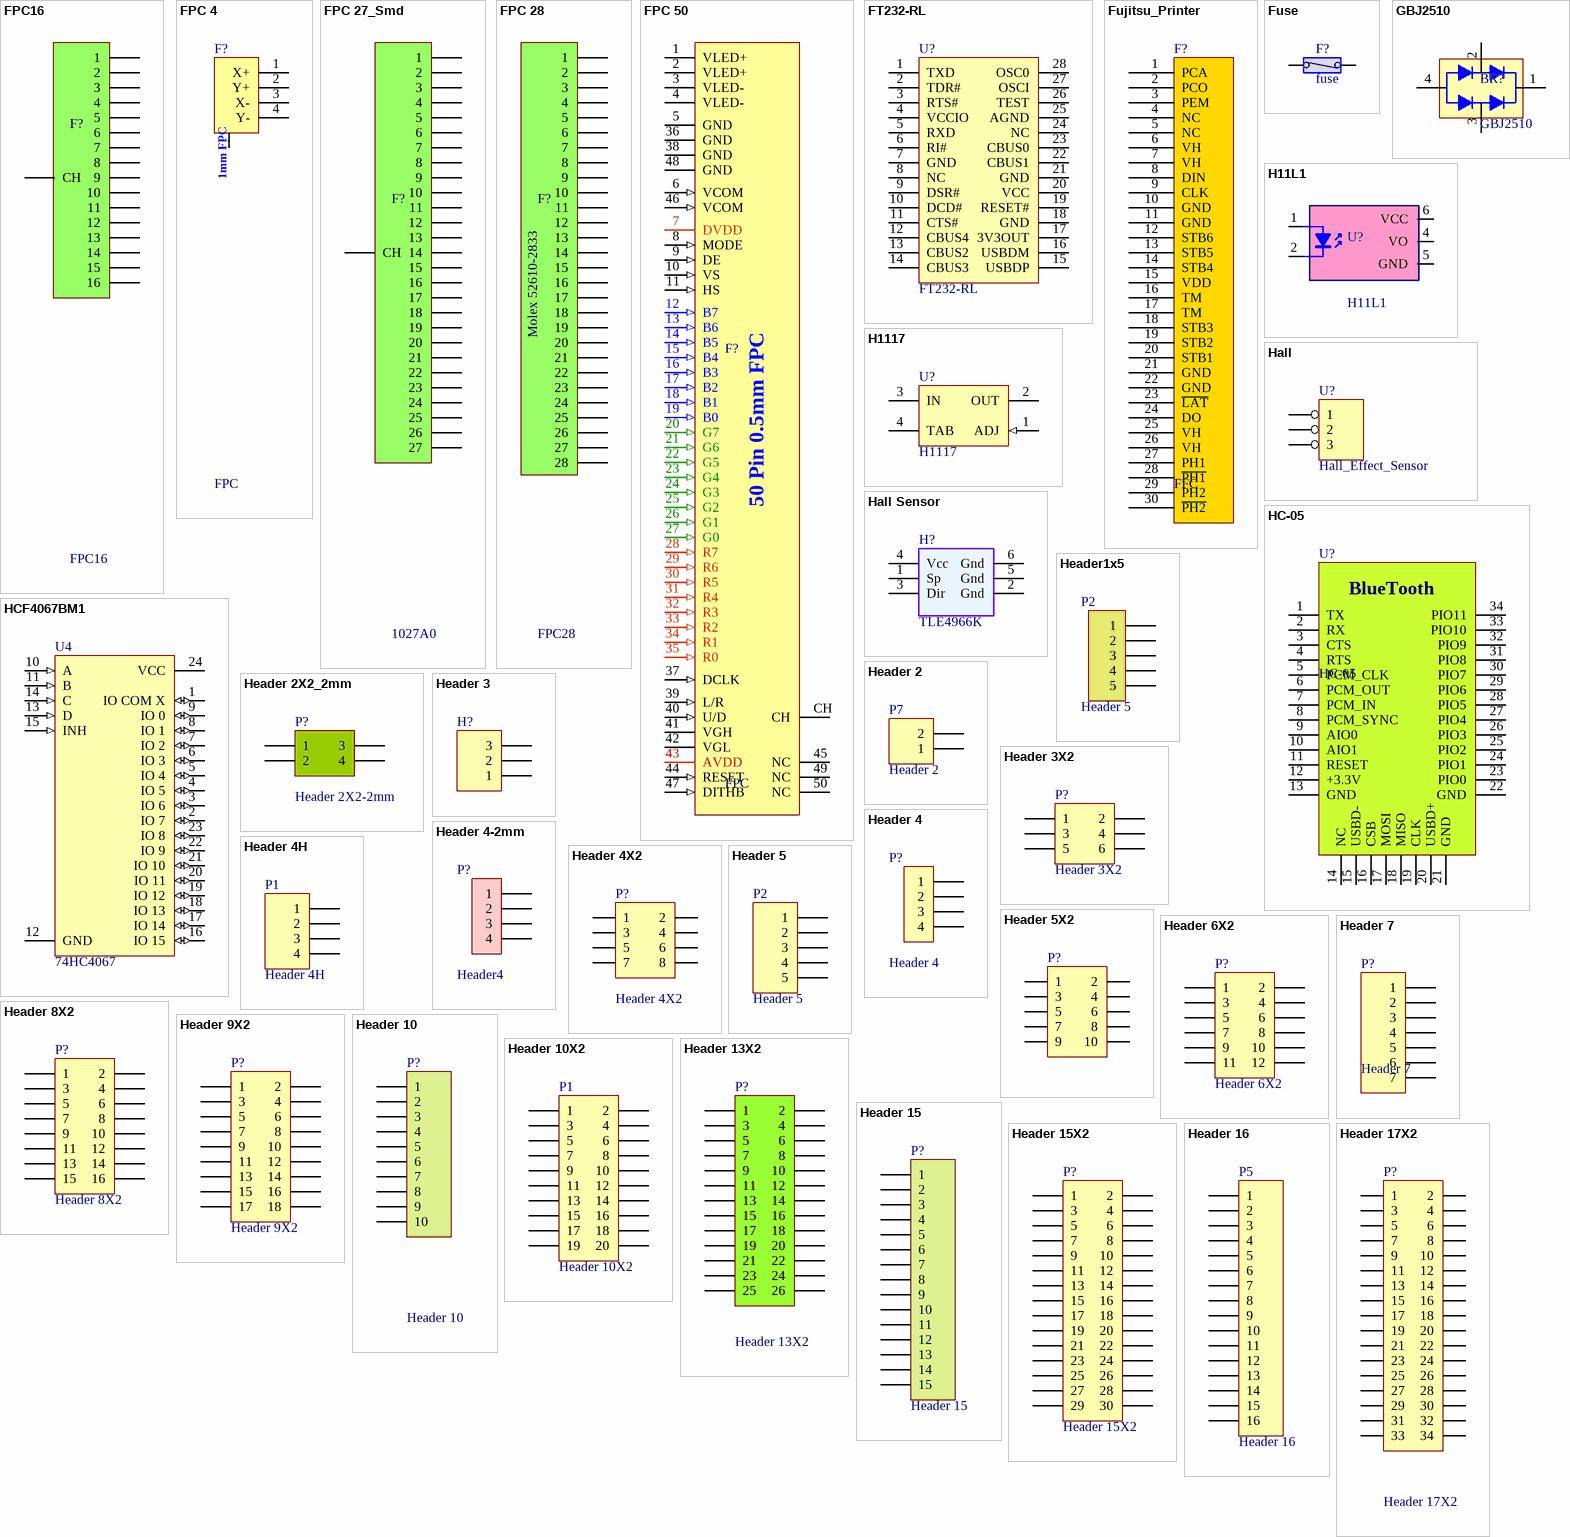
[diagram p7: symbols FPC16 to Header 17X2]

## FPC16
designator F?
FPC connector 16pin smd
footprint FPC 16pin 1mm (Chess Connector)
pins: 1, 2, 3, 4, 5, 6, 7, 8, 9, 10, 11, 12, 13, 14, 15, 16, CH

## FPC 4
designator F?, comment FPC
FPC 4 Pin 1mm
footprint FPC 4pin 1mm (Touch Connector)
pins: 1 X+, 2 Y+, 3 X-, 4 Y-, CH
text: 1mm FPC

## FPC 27_Smd
designator F?, comment 1027A0
FPC connector 27pin smd with Lock
footprint FPC 27pin 1mm (1027-A0 FPC1.0)
pins: 1, 2, 3, 4, 5, 6, 7, 8, 9, 10, 11, 12, 13, 14, 15, 16, 17, 18, 19, 20, 21, 22, 23, 24, 25, 26, 27, CH

## FPC 28
designator F?, comment FPC28
1.00mm Pitch Easy-On™ Type FFC/FPC Connector, Surface Mount, Vertical, ZIF Receptacle, 28 Circuits; Part Number: 52610-2833; Link: http://www.molex.com/molex/products/datasheet.jsp?part=active/0526102833_FFC_FPC_CONNECTORS.xml
footprint ffc Connector 28 (Molex Part Number: 52610-0533)
pins: 1, 2, 3, 4, 5, 6, 7, 8, 9, 10, 11, 12, 13, 14, 15, 16, 17, 18, 19, 20, 21, 22, 23, 24, 25, 26, 27, 28
text: Molex 52610-2833

## FPC 50
designator F?, comment FPC
FPC connector 50 pin
footprint FPC 50pin 0.5 mm (FPC 50pin .5 mm)
pins: 1 VLED+ (power), 2 VLED+ (power), 3 VLED- (power), 4 VLED- (power), 5 GND (power), 6 VCOM (in), 7 DVDD, 8 MODE  (in), 9 DE (in), 10 VS (in), 11 HS (in), 12 B7 (in), 13 B6 (in), 14 B5 (in), 15 B4 (in), 16 B3 (in), 17 B2 (in), 18 B1 (in), 19 B0 (in), 20 G7 (in), 21 G6 (in), 22 G5 (in), 23 G4 (in), 24 G3 (in), 25 G2 (in), 26 G1 (in), 27 G0 (in), 28 R7 (in), 29 R6 (in), 30 R5 (in), 31 R4 (in), 32 R3 (in), 33 R2 (in), 34 R1 (in), 35 R0 (in), 36 GND, 37 DCLK (in), 38 GND, 39 L/R (in), 40 U/D  (in), 41 VGH, 42 VGL, 43 AVDD, 44 RESET (in), 45 NC, 46 VCOM (in), 47 DITHB (in), 48 GND, 49 NC, 50 NC, CH
text: 50 Pin 0.5mm FPC

## FT232-RL
designator U?
footprint SSOP-28
pins: 1 TXD, 2 TDR#, 3 RTS#, 4 VCCIO, 5 RXD, 6 RI#, 7 GND, 8 NC, 9 DSR#, 10 DCD#, 11 CTS#, 12 CBUS4, 13 CBUS2, 14 CBUS3, 15 USBDP, 16 USBDM, 17 3V3OUT, 18 GND, 19 RESET#, 20 VCC, 21 GND, 22 CBUS1, 23 CBUS0, 24 NC, 25 AGND, 26 TEST, 27 OSCI, 28 OSC0

## Fujitsu_Printer
designator F?, comment FFC
FFC connector 30 pin
footprint ffc Connector 30
pins: 1 PCA, 2 PCO, 3 PEM, 4 NC, 5 NC, 6 VH, 7 VH, 8 DIN, 9 CLK, 10 GND, 11 GND, 12 STB6, 13 STB5, 14 STB4, 15 VDD, 16 TM, 17 TM, 18 STB3, 19 STB2, 20 STB1, 21 GND, 22 GND, 23 ~{LAT}, 24 DO, 25 VH, 26 VH, 27 PH1, 28 ~{PH1}, 29 PH2, 30 ~{PH2}

## Fuse
designator F?, comment fuse
footprint fuse
footprint fuse2
pins: 1, 2

## GBJ2510
designator BR?
25A GLASS PASSIVATED BRIDGE RECTIFIER
footprint Bridge_KBP204 (KBP204 Diode Bridge)
pins: 1, 2, 3, 4

## H11L1
designator U?
6  PIN DIP   S  CHMITT TRIGGER  P  H  OTOCOUPLE  R
footprint DIP6 (DIP; 6 Leads; Row Spacing 7.62 mm; Pitch 2.54 mm)
pins: 1 A "Anode", 2 K "Cathode", 4 VO "Collector", 5 GND "Emitter", 6 VCC "Emitter"

## H1117
designator U?
3.3 Volt Regulator; PartNumber: LM317EMP; Manufacturer: National Semiconductor; CompType: LDO IC; PackageTopMarking: XYTT*N01A; PowerWise: N; Published: 4-Dec-2008; DatasheetVersion: Apr-2007; PackageVersion: revB, Apr-2003; PackageReference: MP04A; Publisher: Altium Limited; PackageDescription: Molded SOT-223, 6.50 x 3.56 x 1.6mm Body, 4 Lead, 2.3mm Pitch; RoHS: O; PinCount: 4; DigiKeyPartNumber: LM317EMPCT-ND; Code_JEDEC: TO-261-AA; Code_IPC: SOT223-4; ComponentLink1Description: LM317 Datasheet; ComponentLink1URL: http://www.national.com/ds/LM/LM317.pdf; ComponentLink2Description: LM317 Web Page; ComponentLink2URL: http://www.national.com/pf/LM/LM317.html; ComponentLink3Description: MP04A Package Page; ComponentLink3URL: http://www.national.com/packaging/folders/mp04a.html
footprint SOT223
pins: 1 ADJ (in), 2 OUT (power), 3 IN (power), 4 TAB (power)

## Hall
designator U?, comment Hall_Effect_Sensor
footprint HALL_EFFECT_SENSOR
pins: 1, 2, 3

## Hall Sensor
designator H?, comment TLE4966K
High Precision Hall-Effect Switch with   Direction Detection
footprint PG-TSOP6 (High Precision Hall-Effect Switch with   Direction Detection)
pins: 1 Sp "Speed", 2 Gnd, 3 Dir "Direction", 4 Vcc "Supply voltage", 5 Gnd, 6 Gnd

## HC-05
designator U?
HC-05 Embedded Bluetooth Serial Module; Link: http://javanelec.com/productsDetails.aspx?id=23721; Price: 19000 Toman
footprint HC-05 (Bluetooth module footprint)
pins: 1 TX, 2 RX, 3 CTS, 4 RTS, 5 PCM_CLK, 6 PCM_OUT, 7 PCM_IN, 8 PCM_SYNC, 9 AIO0, 10 AIO1, 11 RESET, 12 +3.3V, 13 GND, 14 NC, 15 USBD-, 16 CSB, 17 MOSI, 18 MISO, 19 CLK, 20 USBD+, 21 GND, 22 GND, 23 PIO0, 24 PIO1, 25 PIO2, 26 PIO3, 27 PIO4, 28 PIO5, 29 PIO6, 30 PIO7, 31 PIO8, 32 PIO9, 33 PIO10, 34 PIO11
text: BlueTooth

## HCF4067BM1
designator U4, comment 74HC4067
Analog Multiplexer/Demultiplexer; Published: 8-Jun-2000; LatestRevisionDate: 13-Apr-2006; LatestRevisionNote: IPC-7351 Footprint Added.; DatasheetVersion: Sep-1988; PackageVersion: Oct-2001; PackageReference: SO24; Publisher: Altium Limited; PackageDescription: 24-Pin Plastic Small Outline Integrated Circuit 1.27 mm Pitch; ComponentLink1Description: Manufacturer Link; ComponentLink1URL: http://www.st.com/; ComponentLink2Description: Datasheet; ComponentLink2URL: http://www.st.com/stonline/products/literature/ds/2058/hcf4067.pdf
footprint SO24_N (SOIC, 24-Leads, Body 15.4x7.5mm, Pitch 1.27mm, IPC Medium Density)
footprint SO24_L (SOIC, 24-Leads, Body 15.4x7.5mm, Pitch 1.27mm, IPC High Density)
footprint SO24_M (SOIC, 24-Leads, Body 15.4x7.5mm, Pitch 1.27mm, IPC Low Density)
pins: 1 IO COM X (io), 2 IO 7 (io), 3 IO 6 (io), 4 IO 5 (io), 5 IO 4 (io), 6 IO 3 (io), 7 IO 2 (io), 8 IO 1 (io), 9 IO 0 (io), 10 A (in), 11 B (in), 12 GND (power), 13 D (in), 14 C (in), 15 INH (in), 16 IO 15 (io), 17 IO 14 (io), 18 IO 13 (io), 19 IO 12 (io), 20 IO 11 (io), 21 IO 10 (io), 22 IO 9 (io), 23 IO 8 (io), 24 VCC (power)

## Header1x5
designator P2, comment Header 5
Heder 1x5; LatestRevisionDate: 17-Jul-2002; LatestRevisionNote: Re-released for DXP Platform.; Publisher: Altium Limited
footprint Header1x5 (Header; 5 Position)
pins: 1, 2, 3, 4, 5

## Header 2
designator P7
Header, 2-Pin; LatestRevisionDate: 17-Jul-2002; LatestRevisionNote: Re-released for DXP Platform.; Publisher: Altium Limited
footprint HDR1X2 (Connector; Header; 2 Position)
pins: 1, 2

## Header 2X2_2mm
designator P?, comment Header 2X2-2mm
Header, 4-Pin, Dual row; LatestRevisionDate: 17-Jul-2002; LatestRevisionNote: Re-released for DXP Platform.; Publisher: Altium Limited
footprint Header2x2 -2mm (Header; 4 Position)
pins: 1, 2, 3, 4

## Header 3
designator H?  (value not drawn)
Header, 3-Pin; LatestRevisionDate: 17-Jul-2002; LatestRevisionNote: Re-released for DXP Platform.; Publisher: Altium Limited
footprint HDR1X3 (Connector; Header; 3 Position)
signal-integrity model Connector
footprint Header1x3 (Header; 3 Position)
pins: 1, 2, 3

## Header 3X2
designator P?
Header, 3-Pin, Dual row; LatestRevisionDate: 17-Jul-2002; LatestRevisionNote: Re-released for DXP Platform.; Publisher: Altium Limited
footprint HDR2X3 (Connector; Header; 3x2 Position)
pins: 1, 2, 3, 4, 5, 6

## Header 4
designator P?
Header, 4-Pin; LatestRevisionDate: 17-Jul-2002; LatestRevisionNote: Re-released for DXP Platform.; Publisher: Altium Limited
footprint Header1x4 (Header; 4 Position)
pins: 1, 2, 3, 4

## Header 4-2mm
designator P?, comment Header4
Header, 4-Pin 2mm; LatestRevisionDate: 17-Jul-2002; LatestRevisionNote: Re-released for DXP Platform.; Publisher: Altium Limited
footprint Header1x4 -2mm (Header; 4 Position)
pins: 1, 2, 3, 4

## Header 4H
designator P1
Header, 4-Pin, Right Angle; LatestRevisionDate: 17-Jul-2002; LatestRevisionNote: Re-released for DXP Platform.; Publisher: Altium Limited
footprint HDR1X4
pins: 1, 2, 3, 4

## Header 4X2
designator P?
Header, 4-Pin, Dual row; LatestRevisionDate: 17-Jul-2002; LatestRevisionNote: Re-released for DXP Platform.; Publisher: Altium Limited
footprint Header2x4
footprint Header2x4Big
pins: 1, 2, 3, 4, 5, 6, 7, 8

## Header 5
designator P2
Header, 5-Pin; LatestRevisionDate: 17-Jul-2002; LatestRevisionNote: Re-released for DXP Platform.; Publisher: Altium Limited
footprint Header1x5 (Header; 5 Position)
signal-integrity model Connector
footprint terminal_5_2mil
pins: 1, 2, 3, 4, 5

## Header 5X2
designator P?
Header, 5-Pin, Dual row; LatestRevisionDate: 17-Jul-2002; LatestRevisionNote: Re-released for DXP Platform.; Publisher: Altium Limited
footprint Header2x5
pins: 1, 2, 3, 4, 5, 6, 7, 8, 9, 10

## Header 6X2
designator P?
Header, 6-Pin, Dual row; LatestRevisionDate: 17-Jul-2002; LatestRevisionNote: Re-released for DXP Platform.; Publisher: Altium Limited
footprint HDR2X6 (Connector; Header; 6x2 Position)
pins: 1, 2, 3, 4, 5, 6, 7, 8, 9, 10, 11, 12

## Header 7
designator P?
Header, 7; LatestRevisionDate: 17-Jul-2002; LatestRevisionNote: Re-released for DXP Platform.; Publisher: Altium Limited
footprint Header1x7 (Header; 7 Position)
pins: 1, 2, 3, 4, 5, 6, 7